# Altium footprint library ST封装.PcbLib: 1336 footprints (part 72 of 109)
Each footprint in its own frame and in the unit in brackets; x right, y up, seen from the top. Pads: shape width x height; smd on the part's side, far side on the other; paste and mask are expansions set on the pad; w line width, h text height; cw(c..) or ccw(c..) is an arc to the next point about the centre after c.
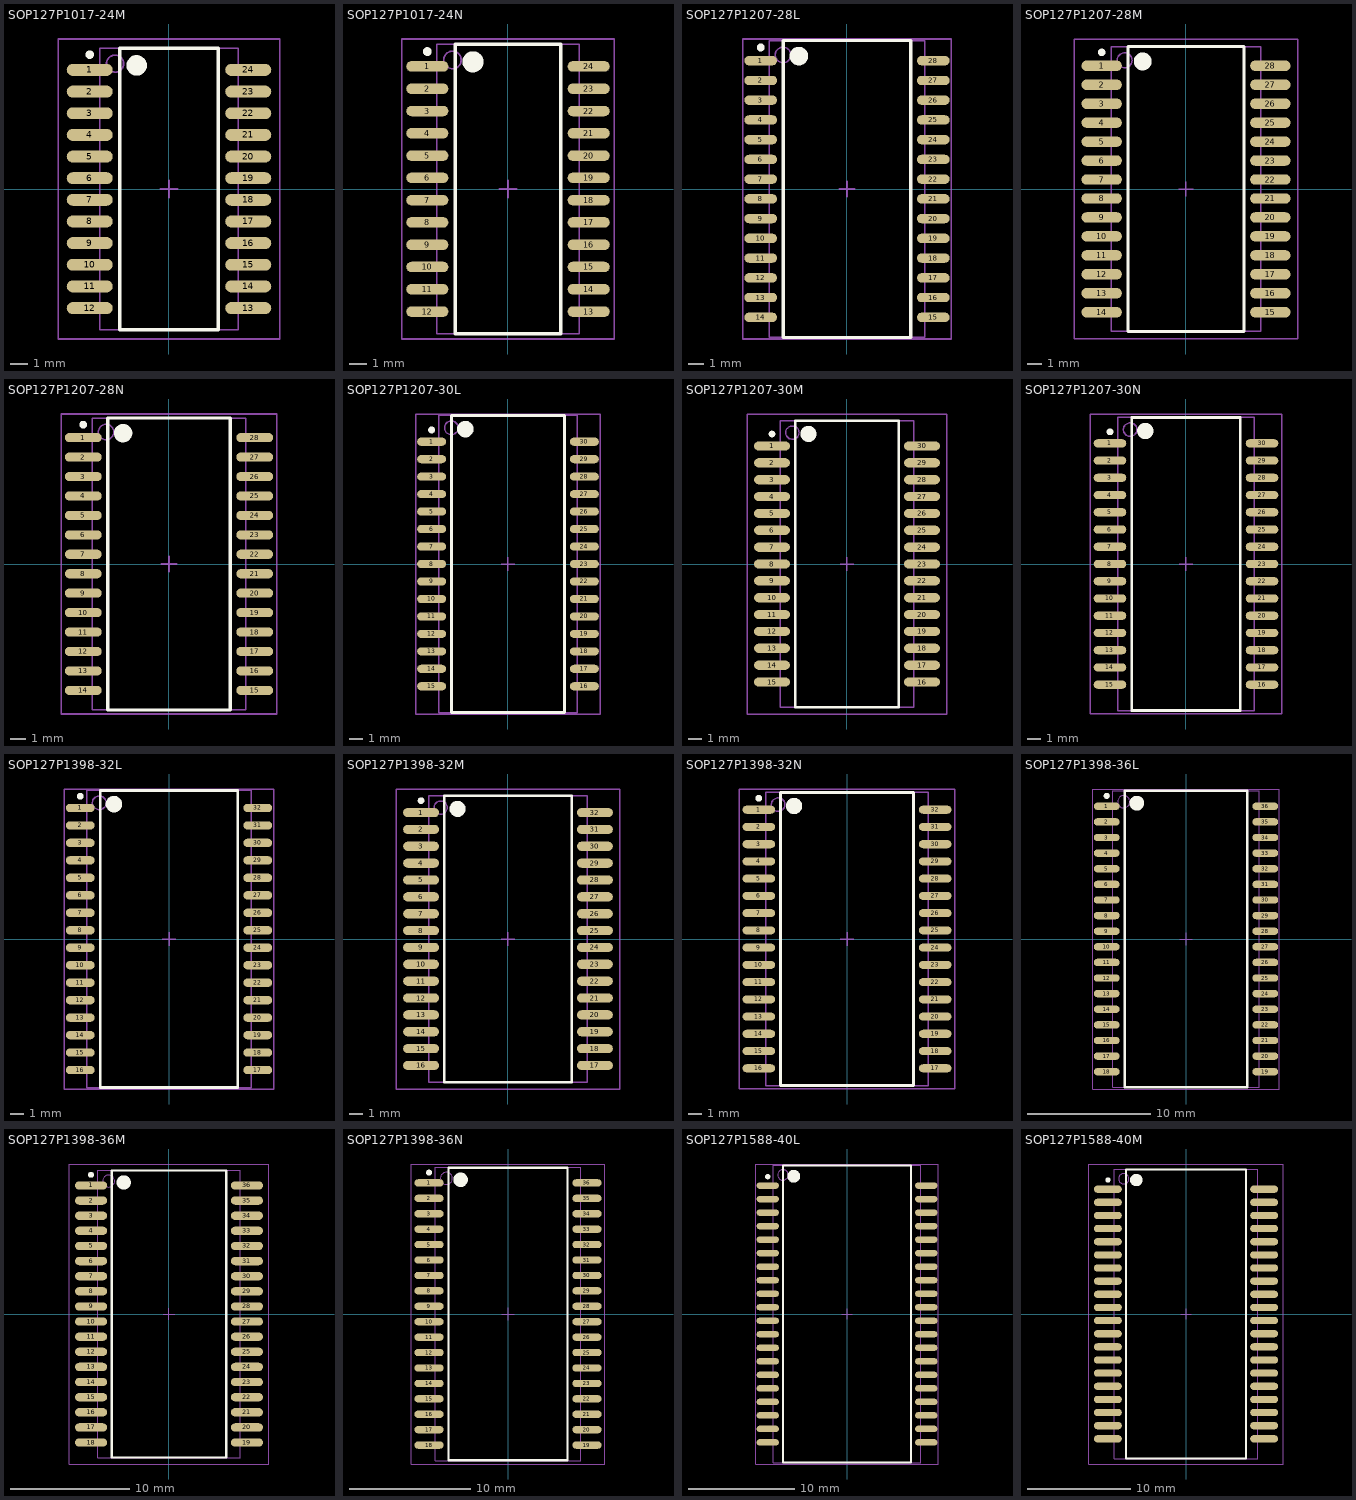
[diagram p71: the footprints below, top view; thin cyan lines are the x and y axes]

## SOP127P1017-24M [mm] "SOP, 24-Leads, Body 15.6x8.1mm, Pitch 1.27mm, IPC Low Density"
height 2.5
pads (24):
  oval 2.7x0.7 smd: 1(-4.65,6.985) 2(-4.65,5.715) 3(-4.65,4.445) 4(-4.65,3.175) 5(-4.65,1.905) 6(-4.65,0.635) 7(-4.65,-0.635) 8(-4.65,-1.905) 9(-4.65,-3.175) 10(-4.65,-4.445) 11(-4.65,-5.715) 12(-4.65,-6.985) 13(4.65,-6.985) 14(4.65,-5.715) 15(4.65,-4.445) 16(4.65,-3.175) 17(4.65,-1.905) 18(4.65,-0.635) 19(4.65,0.635) 20(4.65,1.905) 21(4.65,3.175) 22(4.65,4.445) 23(4.65,5.715) 24(4.65,6.985)
Top Overlay:
  circle w0.6: c-1.9,7.25 r0.3
  circle w0.25: c-4.65,7.885 r0.125
  lines w0.2: -2.9,-8.25 2.9,-8.25 2.9,8.25 -2.9,8.25 -2.9,-8.25
Mechanical 13:
  circle w0.1: c-3.165,7.355 r0.5
  lines w0.1: -4.065,-8.255 4.065,-8.255 4.065,8.255 -4.065,8.255 -4.065,-8.255
Mechanical 15:
  lines w0.1: -0.5,0 0.5,0 ; 0,-0.5 0,0.5 ; -6.5,-8.8 6.5,-8.8 6.5,8.8 -6.5,8.8 -6.5,-8.8
3D body: height 2.5, standoff 0, extent -4.065,-8.255 4.065,8.255

## SOP127P1017-24N [mm] "SOP, 24-Leads, Body 15.6x8.1mm, Pitch 1.27mm, IPC Medium Density"
height 2.5
pads (24):
  oval 2.4x0.6 smd: 1(-4.6,6.985) 2(-4.6,5.715) 3(-4.6,4.445) 4(-4.6,3.175) 5(-4.6,1.905) 6(-4.6,0.635) 7(-4.6,-0.635) 8(-4.6,-1.905) 9(-4.6,-3.175) 10(-4.6,-4.445) 11(-4.6,-5.715) 12(-4.6,-6.985) 13(4.6,-6.985) 14(4.6,-5.715) 15(4.6,-4.445) 16(4.6,-3.175) 17(4.6,-1.905) 18(4.6,-0.635) 19(4.6,0.635) 20(4.6,1.905) 21(4.6,3.175) 22(4.6,4.445) 23(4.6,5.715) 24(4.6,6.985)
Top Overlay:
  circle w0.6: c-2,7.25 r0.3
  circle w0.25: c-4.6,7.835 r0.125
  lines w0.2: -3,-8.25 3,-8.25 3,8.25 -3,8.25 -3,-8.25
Mechanical 13:
  circle w0.1: c-3.165,7.355 r0.5
  lines w0.1: -4.065,-8.255 4.065,-8.255 4.065,8.255 -4.065,8.255 -4.065,-8.255
Mechanical 15:
  lines w0.1: -0.5,0 0.5,0 ; 0,-0.5 0,0.5 ; -6.05,-8.55 6.05,-8.55 6.05,8.55 -6.05,8.55 -6.05,-8.55
3D body: height 2.5, standoff 0, extent -4.065,-8.255 4.065,8.255

## SOP127P1207-28L [mm] "SOP, 28-Leads, Body 18.1x8.6mm, Pitch 1.27mm, IPC High Density"
height 3.05
pads (28):
  oval 2.1x0.6 smd: 1(-5.55,8.255) 2(-5.55,6.985) 3(-5.55,5.715) 4(-5.55,4.445) 5(-5.55,3.175) 6(-5.55,1.905) 7(-5.55,0.635) 8(-5.55,-0.635) 9(-5.55,-1.905) 10(-5.55,-3.175) 11(-5.55,-4.445) 12(-5.55,-5.715) 13(-5.55,-6.985) 14(-5.55,-8.255) 15(5.55,-8.255) 16(5.55,-6.985) 17(5.55,-5.715) 18(5.55,-4.445) 19(5.55,-3.175) 20(5.55,-1.905) 21(5.55,-0.635) 22(5.55,0.635) 23(5.55,1.905) 24(5.55,3.175) 25(5.55,4.445) 26(5.55,5.715) 27(5.55,6.985) 28(5.55,8.255)
Top Overlay:
  circle w0.6: c-3.1,8.55 r0.3
  circle w0.25: c-5.55,9.105 r0.125
  lines w0.2: -4.1,-9.55 4.1,-9.55 4.1,9.55 -4.1,9.55 -4.1,-9.55
Mechanical 13:
  circle w0.1: c-4.115,8.625 r0.5
  lines w0.1: -5.015,-9.525 5.015,-9.525 5.015,9.525 -5.015,9.525 -5.015,-9.525
Mechanical 15:
  lines w0.1: -0.5,0 0.5,0 ; 0,-0.5 0,0.5 ; -6.7,-9.65 6.7,-9.65 6.7,9.65 -6.7,9.65 -6.7,-9.65
3D body: height 3.05, standoff 0, extent -5.015,-9.525 5.015,9.525

## SOP127P1207-28M [mm] "SOP, 28-Leads, Body 18.2x10mm, Pitch 1.27mm, IPC Low Density"
height 3
pads (28):
  oval 2.7x0.7 smd: 1(-5.65,8.255) 2(-5.65,6.985) 3(-5.65,5.715) 4(-5.65,4.445) 5(-5.65,3.175) 6(-5.65,1.905) 7(-5.65,0.635) 8(-5.65,-0.635) 9(-5.65,-1.905) 10(-5.65,-3.175) 11(-5.65,-4.445) 12(-5.65,-5.715) 13(-5.65,-6.985) 14(-5.65,-8.255) 15(5.65,-8.255) 16(5.65,-6.985) 17(5.65,-5.715) 18(5.65,-4.445) 19(5.65,-3.175) 20(5.65,-1.905) 21(5.65,-0.635) 22(5.65,0.635) 23(5.65,1.905) 24(5.65,3.175) 25(5.65,4.445) 26(5.65,5.715) 27(5.65,6.985) 28(5.65,8.255)
Top Overlay:
  circle w0.6: c-2.9,8.55 r0.3
  circle w0.25: c-5.65,9.155 r0.125
  lines w0.2: -3.9,-9.55 3.9,-9.55 3.9,9.55 -3.9,9.55 -3.9,-9.55
Mechanical 13:
  circle w0.1: c-4.115,8.625 r0.5
  lines w0.1: -5.015,-9.525 5.015,-9.525 5.015,9.525 -5.015,9.525 -5.015,-9.525
Mechanical 15:
  lines w0.1: -0.5,0 0.5,0 ; 0,-0.5 0,0.5 ; -7.5,-10.05 7.5,-10.05 7.5,10.05 -7.5,10.05 -7.5,-10.05
3D body: height 3, standoff 0, extent -5.015,-9.525 5.015,9.525

## SOP127P1207-28N [mm] "SOP, 28-Leads, Body 18.1x8.6mm, Pitch 1.27mm, IPC Medium Density"
height 3.05
pads (28):
  oval 2.4x0.6 smd: 1(-5.6,8.255) 2(-5.6,6.985) 3(-5.6,5.715) 4(-5.6,4.445) 5(-5.6,3.175) 6(-5.6,1.905) 7(-5.6,0.635) 8(-5.6,-0.635) 9(-5.6,-1.905) 10(-5.6,-3.175) 11(-5.6,-4.445) 12(-5.6,-5.715) 13(-5.6,-6.985) 14(-5.6,-8.255) 15(5.6,-8.255) 16(5.6,-6.985) 17(5.6,-5.715) 18(5.6,-4.445) 19(5.6,-3.175) 20(5.6,-1.905) 21(5.6,-0.635) 22(5.6,0.635) 23(5.6,1.905) 24(5.6,3.175) 25(5.6,4.445) 26(5.6,5.715) 27(5.6,6.985) 28(5.6,8.255)
Top Overlay:
  circle w0.6: c-3,8.55 r0.3
  circle w0.25: c-5.6,9.105 r0.125
  lines w0.2: -4,-9.55 4,-9.55 4,9.55 -4,9.55 -4,-9.55
Mechanical 13:
  circle w0.1: c-4.115,8.625 r0.5
  lines w0.1: -5.015,-9.525 5.015,-9.525 5.015,9.525 -5.015,9.525 -5.015,-9.525
Mechanical 15:
  lines w0.1: -0.5,0 0.5,0 ; 0,-0.5 0,0.5 ; -7.05,-9.8 7.05,-9.8 7.05,9.8 -7.05,9.8 -7.05,-9.8
3D body: height 3.05, standoff 0, extent -5.015,-9.525 5.015,9.525

## SOP127P1207-30L [mm] "SOP, 30-Leads, Body 20.7x10mm, Pitch 1.27mm, IPC High Density"
height 3
pads (30):
  oval 2.1x0.6 smd: 1(-5.55,8.89) 2(-5.55,7.62) 3(-5.55,6.35) 4(-5.55,5.08) 5(-5.55,3.81) 6(-5.55,2.54) 7(-5.55,1.27) 8(-5.55,0) 9(-5.55,-1.27) 10(-5.55,-2.54) 11(-5.55,-3.81) 12(-5.55,-5.08) 13(-5.55,-6.35) 14(-5.55,-7.62) 15(-5.55,-8.89) 16(5.55,-8.89) 17(5.55,-7.62) 18(5.55,-6.35) 19(5.55,-5.08) 20(5.55,-3.81) 21(5.55,-2.54) 22(5.55,-1.27) 23(5.55,0) 24(5.55,1.27) 25(5.55,2.54) 26(5.55,3.81) 27(5.55,5.08) 28(5.55,6.35) 29(5.55,7.62) 30(5.55,8.89)
Top Overlay:
  circle w0.25: c-5.55,9.74 r0.125
  circle w0.6: c-3.1,9.8 r0.3
  lines w0.2: -4.1,-10.8 -4.1,10.8 4.1,10.8 4.1,-10.8 -4.1,-10.8
Mechanical 13:
  circle w0.1: c-4.115,9.895 r0.5
  lines w0.1: -5.015,-10.795 -5.015,10.795 5.015,10.795 5.015,-10.795 -5.015,-10.795
Mechanical 15:
  lines w0.1: -0.5,0 0.5,0 ; 0,-0.5 0,0.5 ; -6.7,-10.9 -6.7,10.9 6.7,10.9 6.7,-10.9 -6.7,-10.9
3D body: height 3, standoff 0, extent -5.015,-10.795 5.015,10.795

## SOP127P1207-30M [mm] "SOP, 30-Leads, Body 20.7x10mm, Pitch 1.27mm, IPC Low Density"
height 3
pads (30):
  oval 2.7x0.7 smd: 1(-5.65,8.89) 2(-5.65,7.62) 3(-5.65,6.35) 4(-5.65,5.08) 5(-5.65,3.81) 6(-5.65,2.54) 7(-5.65,1.27) 8(-5.65,0) 9(-5.65,-1.27) 10(-5.65,-2.54) 11(-5.65,-3.81) 12(-5.65,-5.08) 13(-5.65,-6.35) 14(-5.65,-7.62) 15(-5.65,-8.89) 16(5.65,-8.89) 17(5.65,-7.62) 18(5.65,-6.35) 19(5.65,-5.08) 20(5.65,-3.81) 21(5.65,-2.54) 22(5.65,-1.27) 23(5.65,0) 24(5.65,1.27) 25(5.65,2.54) 26(5.65,3.81) 27(5.65,5.08) 28(5.65,6.35) 29(5.65,7.62) 30(5.65,8.89)
Top Overlay:
  circle w0.6: c-2.9,9.8 r0.3
  circle w0.25: c-5.65,9.79 r0.125
  lines w0.2: -3.9,-10.8 3.9,-10.8 3.9,10.8 -3.9,10.8 -3.9,-10.8
Mechanical 13:
  circle w0.1: c-4.115,9.895 r0.5
  lines w0.1: -5.015,-10.795 5.015,-10.795 5.015,10.795 -5.015,10.795 -5.015,-10.795
Mechanical 15:
  lines w0.1: -0.5,0 0.5,0 ; 0,-0.5 0,0.5 ; -7.5,-11.3 7.5,-11.3 7.5,11.3 -7.5,11.3 -7.5,-11.3
3D body: height 3, standoff 0, extent -5.015,-10.795 5.015,10.795

## SOP127P1207-30N [mm] "SOP, 30-Leads, Body 20.7x10mm, Pitch 1.27mm, IPC Medium Density"
height 3
pads (30):
  oval 2.4x0.6 smd: 1(-5.6,8.89) 2(-5.6,7.62) 3(-5.6,6.35) 4(-5.6,5.08) 5(-5.6,3.81) 6(-5.6,2.54) 7(-5.6,1.27) 8(-5.6,0) 9(-5.6,-1.27) 10(-5.6,-2.54) 11(-5.6,-3.81) 12(-5.6,-5.08) 13(-5.6,-6.35) 14(-5.6,-7.62) 15(-5.6,-8.89) 16(5.6,-8.89) 17(5.6,-7.62) 18(5.6,-6.35) 19(5.6,-5.08) 20(5.6,-3.81) 21(5.6,-2.54) 22(5.6,-1.27) 23(5.6,0) 24(5.6,1.27) 25(5.6,2.54) 26(5.6,3.81) 27(5.6,5.08) 28(5.6,6.35) 29(5.6,7.62) 30(5.6,8.89)
Top Overlay:
  circle w0.6: c-3,9.8 r0.3
  circle w0.25: c-5.6,9.74 r0.125
  lines w0.2: -4,-10.8 4,-10.8 4,10.8 -4,10.8 -4,-10.8
Mechanical 13:
  circle w0.1: c-4.115,9.895 r0.5
  lines w0.1: -5.015,-10.795 5.015,-10.795 5.015,10.795 -5.015,10.795 -5.015,-10.795
Mechanical 15:
  lines w0.1: -0.5,0 0.5,0 ; 0,-0.5 0,0.5 ; -7.05,-11.05 7.05,-11.05 7.05,11.05 -7.05,11.05 -7.05,-11.05
3D body: height 3, standoff 0, extent -5.015,-10.795 5.015,10.795

## SOP127P1398-32L [mm] "SOP, 32-Leads, Body 20.7x11.9mm, Pitch 1.27mm, IPC High Density"
height 3.5
pads (32):
  oval 2.1x0.6 smd: 1(-6.45,9.525) 2(-6.45,8.255) 3(-6.45,6.985) 4(-6.45,5.715) 5(-6.45,4.445) 6(-6.45,3.175) 7(-6.45,1.905) 8(-6.45,0.635) 9(-6.45,-0.635) 10(-6.45,-1.905) 11(-6.45,-3.175) 12(-6.45,-4.445) 13(-6.45,-5.715) 14(-6.45,-6.985) 15(-6.45,-8.255) 16(-6.45,-9.525) 17(6.45,-9.525) 18(6.45,-8.255) 19(6.45,-6.985) 20(6.45,-5.715) 21(6.45,-4.445) 22(6.45,-3.175) 23(6.45,-1.905) 24(6.45,-0.635) 25(6.45,0.635) 26(6.45,1.905) 27(6.45,3.175) 28(6.45,4.445) 29(6.45,5.715) 30(6.45,6.985) 31(6.45,8.255) 32(6.45,9.525)
Top Overlay:
  circle w0.6: c-4,9.8 r0.3
  circle w0.25: c-6.45,10.375 r0.125
  lines w0.2: -5,-10.8 5,-10.8 5,10.8 -5,10.8 -5,-10.8
Mechanical 13:
  circle w0.1: c-5.07,9.895 r0.5
  lines w0.1: -5.97,-10.795 5.97,-10.795 5.97,10.795 -5.97,10.795 -5.97,-10.795
Mechanical 15:
  lines w0.1: -0.5,0 0.5,0 ; 0,-0.5 0,0.5 ; -7.6,-10.9 7.6,-10.9 7.6,10.9 -7.6,10.9 -7.6,-10.9
3D body: height 3.5, standoff 0, extent -5.97,-10.795 5.97,10.795

## SOP127P1398-32M [mm] "SOP, 32-Leads, Body 20.7x11.9mm, Pitch 1.27mm, IPC Low Density"
height 3.5
pads (32):
  oval 2.7x0.7 smd: 1(-6.55,9.525) 2(-6.55,8.255) 3(-6.55,6.985) 4(-6.55,5.715) 5(-6.55,4.445) 6(-6.55,3.175) 7(-6.55,1.905) 8(-6.55,0.635) 9(-6.55,-0.635) 10(-6.55,-1.905) 11(-6.55,-3.175) 12(-6.55,-4.445) 13(-6.55,-5.715) 14(-6.55,-6.985) 15(-6.55,-8.255) 16(-6.55,-9.525) 17(6.55,-9.525) 18(6.55,-8.255) 19(6.55,-6.985) 20(6.55,-5.715) 21(6.55,-4.445) 22(6.55,-3.175) 23(6.55,-1.905) 24(6.55,-0.635) 25(6.55,0.635) 26(6.55,1.905) 27(6.55,3.175) 28(6.55,4.445) 29(6.55,5.715) 30(6.55,6.985) 31(6.55,8.255) 32(6.55,9.525)
Top Overlay:
  circle w0.6: c-3.8,9.8 r0.3
  circle w0.25: c-6.55,10.425 r0.125
  lines w0.2: -4.8,-10.8 4.8,-10.8 4.8,10.8 -4.8,10.8 -4.8,-10.8
Mechanical 13:
  circle w0.1: c-5.07,9.895 r0.5
  lines w0.1: -5.97,-10.795 5.97,-10.795 5.97,10.795 -5.97,10.795 -5.97,-10.795
Mechanical 15:
  lines w0.1: -0.5,0 0.5,0 ; 0,-0.5 0,0.5 ; -8.4,-11.3 8.4,-11.3 8.4,11.3 -8.4,11.3 -8.4,-11.3
3D body: height 3.5, standoff 0, extent -5.97,-10.795 5.97,10.795

## SOP127P1398-32N [mm] "SOP, 32-Leads, Body 20.7x11.9mm, Pitch 1.27mm, IPC Medium Density"
height 3.5
pads (32):
  oval 2.4x0.6 smd: 1(-6.5,9.525) 2(-6.5,8.255) 3(-6.5,6.985) 4(-6.5,5.715) 5(-6.5,4.445) 6(-6.5,3.175) 7(-6.5,1.905) 8(-6.5,0.635) 9(-6.5,-0.635) 10(-6.5,-1.905) 11(-6.5,-3.175) 12(-6.5,-4.445) 13(-6.5,-5.715) 14(-6.5,-6.985) 15(-6.5,-8.255) 16(-6.5,-9.525) 17(6.5,-9.525) 18(6.5,-8.255) 19(6.5,-6.985) 20(6.5,-5.715) 21(6.5,-4.445) 22(6.5,-3.175) 23(6.5,-1.905) 24(6.5,-0.635) 25(6.5,0.635) 26(6.5,1.905) 27(6.5,3.175) 28(6.5,4.445) 29(6.5,5.715) 30(6.5,6.985) 31(6.5,8.255) 32(6.5,9.525)
Top Overlay:
  circle w0.6: c-3.9,9.8 r0.3
  circle w0.25: c-6.5,10.375 r0.125
  lines w0.2: -4.9,-10.8 4.9,-10.8 4.9,10.8 -4.9,10.8 -4.9,-10.8
Mechanical 13:
  circle w0.1: c-5.07,9.895 r0.5
  lines w0.1: -5.97,-10.795 5.97,-10.795 5.97,10.795 -5.97,10.795 -5.97,-10.795
Mechanical 15:
  lines w0.1: -0.5,0 0.5,0 ; 0,-0.5 0,0.5 ; -7.95,-11.05 7.95,-11.05 7.95,11.05 -7.95,11.05 -7.95,-11.05
3D body: height 3.5, standoff 0, extent -5.97,-10.795 5.97,10.795

## SOP127P1398-36L [mm] "SOP, 36-Leads, Body 23.2x11.9mm, Pitch 1.27mm, IPC High Density"
height 3.5
pads (36):
  oval 2.1x0.6 smd: 1(-6.45,10.795) 2(-6.45,9.525) 3(-6.45,8.255) 4(-6.45,6.985) 5(-6.45,5.715) 6(-6.45,4.445) 7(-6.45,3.175) 8(-6.45,1.905) 9(-6.45,0.635) 10(-6.45,-0.635) 11(-6.45,-1.905) 12(-6.45,-3.175) 13(-6.45,-4.445) 14(-6.45,-5.715) 15(-6.45,-6.985) 16(-6.45,-8.255) 17(-6.45,-9.525) 18(-6.45,-10.795) 19(6.45,-10.795) 20(6.45,-9.525) 21(6.45,-8.255) 22(6.45,-6.985) 23(6.45,-5.715) 24(6.45,-4.445) 25(6.45,-3.175) 26(6.45,-1.905) 27(6.45,-0.635) 28(6.45,0.635) 29(6.45,1.905) 30(6.45,3.175) 31(6.45,4.445) 32(6.45,5.715) 33(6.45,6.985) 34(6.45,8.255) 35(6.45,9.525) 36(6.45,10.795)
Top Overlay:
  circle w0.6: c-4,11.05 r0.3
  circle w0.25: c-6.45,11.645 r0.125
  lines w0.2: -5,-12.05 5,-12.05 5,12.05 -5,12.05 -5,-12.05
Mechanical 13:
  circle w0.1: c-5.07,11.165 r0.5
  lines w0.1: -5.97,-12.065 5.97,-12.065 5.97,12.065 -5.97,12.065 -5.97,-12.065
Mechanical 15:
  lines w0.1: -0.5,0 0.5,0 ; 0,-0.5 0,0.5 ; -7.6,-12.2 7.6,-12.2 7.6,12.2 -7.6,12.2 -7.6,-12.2
3D body: height 3.5, standoff 0, extent -5.97,-12.065 5.97,12.065

## SOP127P1398-36M [mm] "SOP, 36-Leads, Body 23.2x11.9mm, Pitch 1.27mm, IPC Low Density"
height 3.5
pads (36):
  oval 2.7x0.7 smd: 1(-6.55,10.795) 2(-6.55,9.525) 3(-6.55,8.255) 4(-6.55,6.985) 5(-6.55,5.715) 6(-6.55,4.445) 7(-6.55,3.175) 8(-6.55,1.905) 9(-6.55,0.635) 10(-6.55,-0.635) 11(-6.55,-1.905) 12(-6.55,-3.175) 13(-6.55,-4.445) 14(-6.55,-5.715) 15(-6.55,-6.985) 16(-6.55,-8.255) 17(-6.55,-9.525) 18(-6.55,-10.795) 19(6.55,-10.795) 20(6.55,-9.525) 21(6.55,-8.255) 22(6.55,-6.985) 23(6.55,-5.715) 24(6.55,-4.445) 25(6.55,-3.175) 26(6.55,-1.905) 27(6.55,-0.635) 28(6.55,0.635) 29(6.55,1.905) 30(6.55,3.175) 31(6.55,4.445) 32(6.55,5.715) 33(6.55,6.985) 34(6.55,8.255) 35(6.55,9.525) 36(6.55,10.795)
Top Overlay:
  circle w0.6: c-3.8,11.05 r0.3
  circle w0.25: c-6.55,11.695 r0.125
  lines w0.2: -4.8,-12.05 4.8,-12.05 4.8,12.05 -4.8,12.05 -4.8,-12.05
Mechanical 13:
  circle w0.1: c-5.07,11.165 r0.5
  lines w0.1: -5.97,-12.065 5.97,-12.065 5.97,12.065 -5.97,12.065 -5.97,-12.065
Mechanical 15:
  lines w0.1: -0.5,0 0.5,0 ; 0,-0.5 0,0.5 ; -8.4,-12.6 8.4,-12.6 8.4,12.6 -8.4,12.6 -8.4,-12.6
3D body: height 3.5, standoff 0, extent -5.97,-12.065 5.97,12.065

## SOP127P1398-36N [mm] "SOP, 36-Leads, Body 23.2x11.9mm, Pitch 1.27mm, IPC Medium Density"
height 3.5
pads (36):
  oval 2.4x0.6 smd: 1(-6.5,10.795) 2(-6.5,9.525) 3(-6.5,8.255) 4(-6.5,6.985) 5(-6.5,5.715) 6(-6.5,4.445) 7(-6.5,3.175) 8(-6.5,1.905) 9(-6.5,0.635) 10(-6.5,-0.635) 11(-6.5,-1.905) 12(-6.5,-3.175) 13(-6.5,-4.445) 14(-6.5,-5.715) 15(-6.5,-6.985) 16(-6.5,-8.255) 17(-6.5,-9.525) 18(-6.5,-10.795) 19(6.5,-10.795) 20(6.5,-9.525) 21(6.5,-8.255) 22(6.5,-6.985) 23(6.5,-5.715) 24(6.5,-4.445) 25(6.5,-3.175) 26(6.5,-1.905) 27(6.5,-0.635) 28(6.5,0.635) 29(6.5,1.905) 30(6.5,3.175) 31(6.5,4.445) 32(6.5,5.715) 33(6.5,6.985) 34(6.5,8.255) 35(6.5,9.525) 36(6.5,10.795)
Top Overlay:
  circle w0.6: c-3.9,11.05 r0.3
  circle w0.25: c-6.5,11.645 r0.125
  lines w0.2: -4.9,-12.05 4.9,-12.05 4.9,12.05 -4.9,12.05 -4.9,-12.05
Mechanical 13:
  circle w0.1: c-5.07,11.165 r0.5
  lines w0.1: -5.97,-12.065 5.97,-12.065 5.97,12.065 -5.97,12.065 -5.97,-12.065
Mechanical 15:
  lines w0.1: -0.5,0 0.5,0 ; 0,-0.5 0,0.5 ; -7.95,-12.35 7.95,-12.35 7.95,12.35 -7.95,12.35 -7.95,-12.35
3D body: height 3.5, standoff 0, extent -5.97,-12.065 5.97,12.065

## SOP127P1588-40L [mm] "SOP, 40-Leads, Body 27x13.8mm, Pitch 1.27mm, IPC High Density"
height 4
pads (40):
  oval 2.1x0.6 smd: 1(-7.45,12.065) 2(-7.45,10.795) 3(-7.45,9.525) 4(-7.45,8.255) 5(-7.45,6.985) 6(-7.45,5.715) 7(-7.45,4.445) 8(-7.45,3.175) 9(-7.45,1.905) 10(-7.45,0.635) 11(-7.45,-0.635) 12(-7.45,-1.905) 13(-7.45,-3.175) 14(-7.45,-4.445) 15(-7.45,-5.715) 16(-7.45,-6.985) 17(-7.45,-8.255) 18(-7.45,-9.525) 19(-7.45,-10.795) 20(-7.45,-12.065) 21(7.45,-12.065) 22(7.45,-10.795) 23(7.45,-9.525) 24(7.45,-8.255) 25(7.45,-6.985) 26(7.45,-5.715) 27(7.45,-4.445) 28(7.45,-3.175) 29(7.45,-1.905) 30(7.45,-0.635) 31(7.45,0.635) 32(7.45,1.905) 33(7.45,3.175) 34(7.45,4.445) 35(7.45,5.715) 36(7.45,6.985) 37(7.45,8.255) 38(7.45,9.525) 39(7.45,10.795) 40(7.45,12.065)
Top Overlay:
  circle w0.6: c-5,12.95 r0.3
  circle w0.25: c-7.45,12.915 r0.125
  lines w0.2: -6,-13.95 6,-13.95 6,13.95 -6,13.95 -6,-13.95
Mechanical 13:
  circle w0.1: c-6.02,13.07 r0.5
  lines w0.1: -6.92,-13.97 6.92,-13.97 6.92,13.97 -6.92,13.97 -6.92,-13.97
Mechanical 15:
  lines w0.1: -0.5,0 0.5,0 ; 0,-0.5 0,0.5 ; -8.6,-14.1 8.6,-14.1 8.6,14.1 -8.6,14.1 -8.6,-14.1
3D body: height 4, standoff 0, extent -6.92,-13.97 6.92,13.97

## SOP127P1588-40M [mm] "SOP, 40-Leads, Body 27x13.8mm, Pitch 1.27mm, IPC Low Density"
height 4
pads (40):
  oval 2.7x0.7 smd: 1(-7.55,12.065) 2(-7.55,10.795) 3(-7.55,9.525) 4(-7.55,8.255) 5(-7.55,6.985) 6(-7.55,5.715) 7(-7.55,4.445) 8(-7.55,3.175) 9(-7.55,1.905) 10(-7.55,0.635) 11(-7.55,-0.635) 12(-7.55,-1.905) 13(-7.55,-3.175) 14(-7.55,-4.445) 15(-7.55,-5.715) 16(-7.55,-6.985) 17(-7.55,-8.255) 18(-7.55,-9.525) 19(-7.55,-10.795) 20(-7.55,-12.065) 21(7.55,-12.065) 22(7.55,-10.795) 23(7.55,-9.525) 24(7.55,-8.255) 25(7.55,-6.985) 26(7.55,-5.715) 27(7.55,-4.445) 28(7.55,-3.175) 29(7.55,-1.905) 30(7.55,-0.635) 31(7.55,0.635) 32(7.55,1.905) 33(7.55,3.175) 34(7.55,4.445) 35(7.55,5.715) 36(7.55,6.985) 37(7.55,8.255) 38(7.55,9.525) 39(7.55,10.795) 40(7.55,12.065)
Top Overlay:
  circle w0.6: c-4.8,12.95 r0.3
  circle w0.25: c-7.55,12.965 r0.125
  lines w0.2: -5.8,-13.95 5.8,-13.95 5.8,13.95 -5.8,13.95 -5.8,-13.95
Mechanical 13:
  circle w0.1: c-6.02,13.07 r0.5
  lines w0.1: -6.92,-13.97 6.92,-13.97 6.92,13.97 -6.92,13.97 -6.92,-13.97
Mechanical 15:
  lines w0.1: -0.5,0 0.5,0 ; 0,-0.5 0,0.5 ; -9.4,-14.5 9.4,-14.5 9.4,14.5 -9.4,14.5 -9.4,-14.5
3D body: height 4, standoff 0, extent -6.92,-13.97 6.92,13.97